# Altium footprint library WARG.PcbLib: 58 footprints (part 1 of 4)
Each footprint in its own frame and in the unit in brackets; x right, y up, seen from the top. Pads: shape width x height; smd on the part's side, far side on the other; paste and mask are expansions set on the pad; w line width, h text height; cw(c..) or ccw(c..) is an arc to the next point about the centre after c.
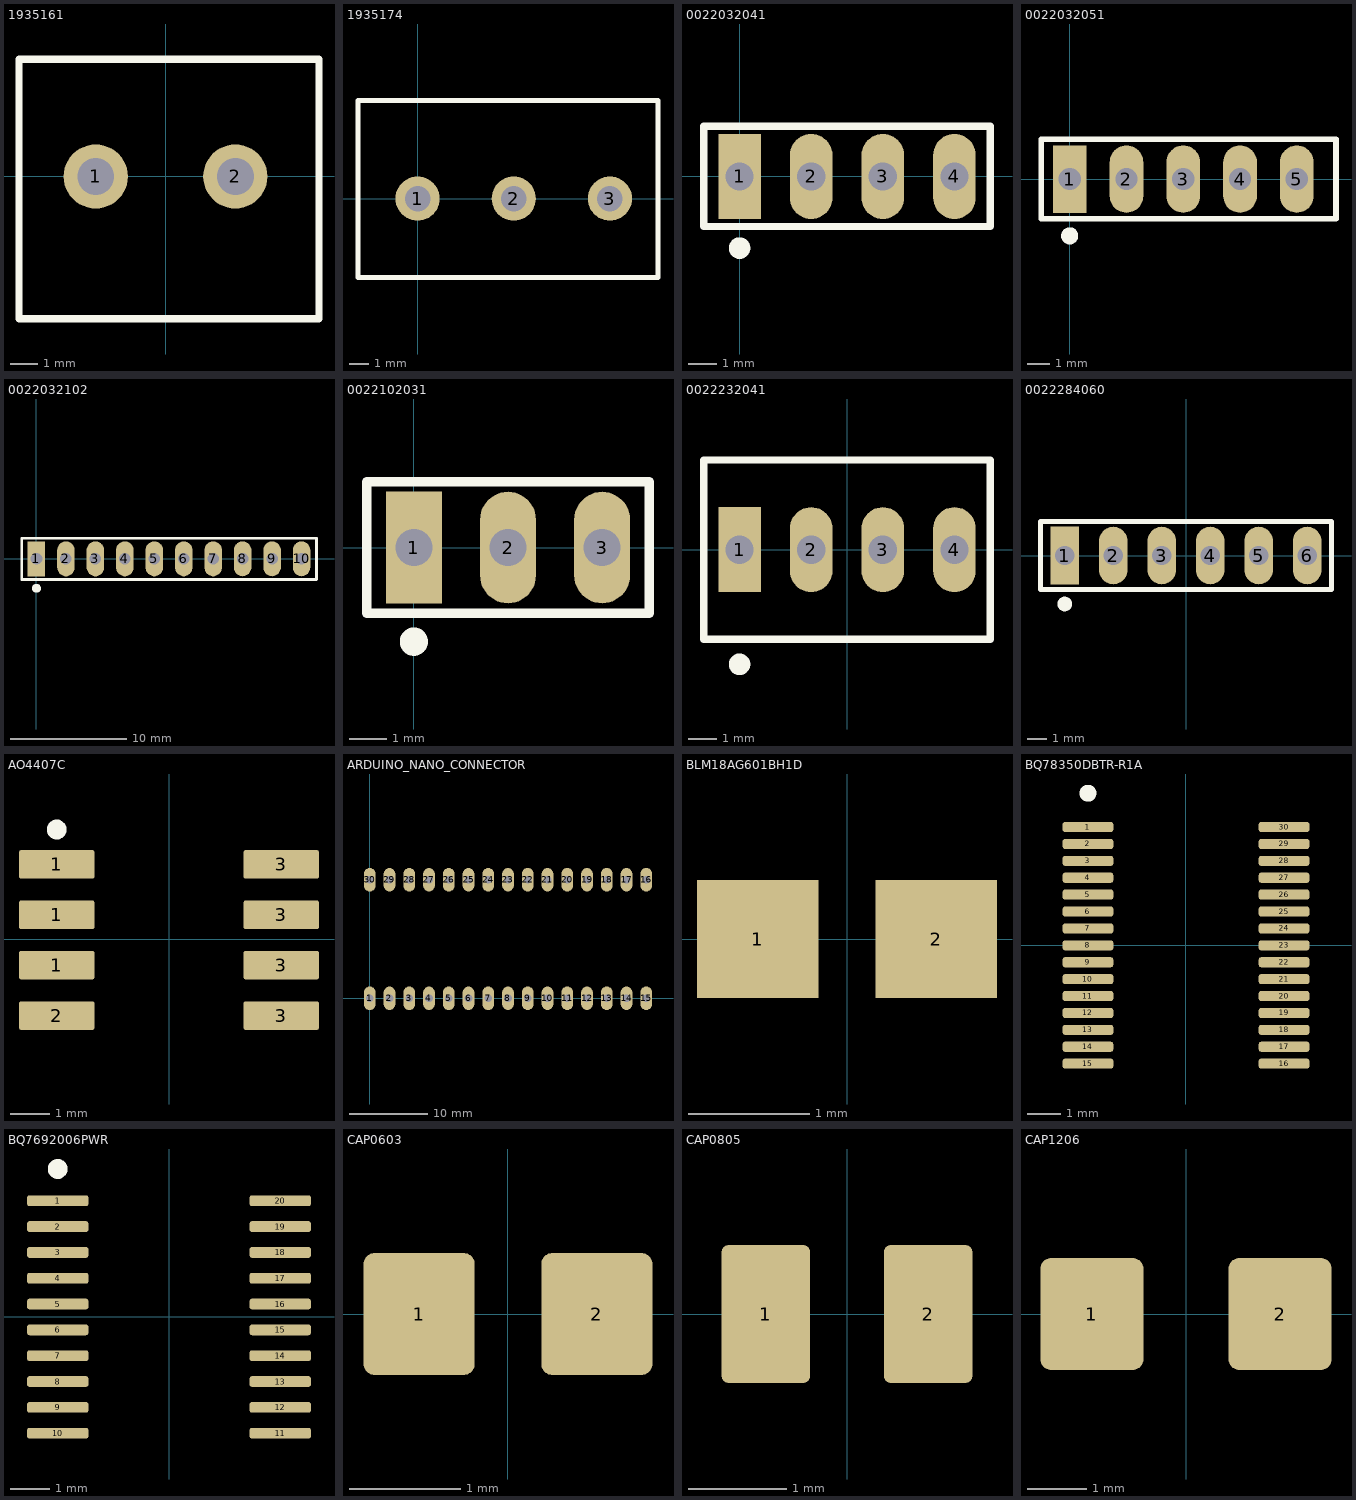
[diagram p0: the footprints below, top view; thin cyan lines are the x and y axes]

## 1935161 [mm] "TERM BLK 2POS SIDE ENTRY 5MM PCB"
pads (2):
  round 2.3 hole 1.325: 1(-2.5,0) 2(2.5,0)
Top Overlay:
  lines w0.254: -5.25,-5.1 -5.25,4.2 5.5,4.2 5.5,-5.1 -5.25,-5.1
3D body "1935161--3DModel-STEP-56544.STEP": height 11.41, standoff -3.49, extent -5.066,-4.936 5.334,4.064

## 1935174 [mm] "TERM BLK 3POS SIDE ENTRY 5MM PCB"
pads (3):
  round 2.3 hole 1.325: 1(0,0) 2(5,0) 3(10,0)
Top Overlay:
  lines w0.254: -3.1,-4.1 -3.1,5.1 12.5,5.1 12.5,-4.1 -3.1,-4.1
3D body "3pin_Phoenix_Contact_Screw_Terminal.STEP": height 11.41, standoff -3.49, extent -3.07,-4 12.5,5

## 0022032041 [mm] "Male 4 Pin Hdr Unshrouded"
pads (4):
  rect 1.508x3.016 hole 1: 1(0,0)
  oval 1.508x3.016 hole 1: 2(2.54,0) 3(5.08,0) 4(7.62,0)
Top Overlay:
  circle w0.508: c0,-2.54 r0.127
  lines w0.254: -1.27,-1.778 8.89,-1.778 8.89,1.27 8.89,1.778 -1.27,1.778 -1.27,1.27 -1.27,-1.778
3D body "0022032041.STEP": height 10.8, standoff -3.42, extent -1.145,-1.17 8.765,1.17

## 0022032051 [mm] "5 Pin Male Header"
pads (5):
  rect 1.508x3.016 hole 1: 1(0,0)
  oval 1.508x3.016 hole 1: 2(2.54,0) 3(5.08,0) 4(7.62,0) 5(10.16,0)
Top Overlay:
  circle w0.508: c0,-2.54 r0.127
  lines w0.254: 11.913,1.753 11.913,-1.778 -1.27,-1.778 -1.27,1.27 -1.27,1.778 11.913,1.778
3D body "0022032051.STEP": height 10.8, standoff -3.42, extent -1.145,-1.17 11.305,1.17

## 0022032102 [mm] "10 Pin Male Header"
pads (10):
  rect 1.508x3.016 hole 1: 1(0,0)
  oval 1.508x3.016 hole 1: 2(2.54,0) 3(5.08,0) 4(7.62,0) 5(10.16,0) 6(12.7,0) 7(15.24,0) 8(17.775,0.005) 9(20.319,0.005) 10(22.855,0.005)
Top Overlay:
  circle w0.508: c0,-2.54 r0.127
  lines w0.254: -1.27,-1.778 11.913,-1.778 24.13,-1.778 24.13,1.778 -1.27,1.778 -1.27,1.27 -1.27,-1.778
3D body "0022032102.STEP": height 14.36, standoff -3.17, extent -1.145,-1.17 24.005,1.17

## 0022102031 [mm] "3 Pin Male Header"
pads (3):
  rect 1.508x3.016 hole 1: 1(0,0)
  oval 1.508x3.016 hole 1: 2(2.54,0) 3(5.08,0)
Top Overlay:
  circle w0.508: c0,-2.54 r0.127
  lines w0.254: -1.27,-1.778 6.35,-1.778 6.35,1.778 -1.27,1.778 -1.27,1.27 -1.27,-1.778
3D body "0022102031.STEP": height 10.8, standoff -3.42, extent -1.145,-1.17 6.225,1.17

## 0022232041 [mm]
pads (4):
  rect 1.508x3.016 hole 1: 1(-3.81,0)
  oval 1.508x3.016 hole 1: 2(-1.27,0) 3(1.27,0) 4(3.81,0)
Top Overlay:
  circle w0.508: c-3.81,-4.064 r0.127
  lines w0.254: -5.08,-3.175 5.08,-3.175 5.08,1.27 5.08,3.175 -5.08,3.175 -5.08,1.27 -5.08,-3.175
3D body "022232041.stp": height 10.68, standoff -3.54, extent -5.004,-3.099 5.004,3.251

## 0022284060 [mm] "6 Pin Male Header"
pads (6):
  rect 1.508x3.016 hole 1: 1(-6.35,0)
  oval 1.508x3.016 hole 1: 2(-3.81,0) 3(-1.27,0) 4(1.27,0) 5(3.81,0) 6(6.35,0)
Top Overlay:
  circle w0.508: c-6.35,-2.54 r0.127
  lines w0.254: -7.62,-1.778 -7.62,1.27 -7.62,1.778 7.62,1.778 7.62,-1.778 5.563,-1.778 -7.62,-1.778
3D body "022284060.stp": height 8.39, standoff -3.16, extent -7.62,-1.245 7.62,1.245

## AO4407C [mm] "MOSFET P-CH 30V 14A SO-8"
pads (8):
  rrect15% 1.9x0.72 smd: 1(-2.827,-0.656) 1(-2.827,0.614) 1(-2.827,1.884) 2(-2.827,-1.926) 3(2.823,-1.926) 3(2.823,-0.656) 3(2.823,0.614) 3(2.823,1.884)
Top Overlay:
  circle w0.25: c-2.827,2.759 r0.125
3D body "User Library-SOIC-8-1.step": height 1.75, standoff 0, extent -3,-2.45 3,2.45

## ARDUINO_NANO_CONNECTOR [mm] "2x15 pin headers"
pads (30):
  oval 1.508x3.016 hole 1: 1(0,0) 2(2.54,0) 3(5.08,0) 4(7.62,0) 5(10.16,0) 6(12.7,0) 7(15.24,0) 8(17.775,0.005) 9(20.319,0.005) 10(22.855,0.005) 11(25.395,0.005) 12(27.935,0.005) 13(30.475,0.005) 14(33.015,0.005) 15(35.555,0.005) 16(35.555,15.245) 17(33.015,15.245) 18(30.475,15.245) 19(27.935,15.245) 20(25.395,15.245) 21(22.855,15.245) 22(20.319,15.245) 23(17.775,15.245) 24(15.24,15.24) 25(12.7,15.24) 26(10.16,15.24) 27(7.62,15.24) 28(5.08,15.24) 29(2.54,15.24) 30(0,15.24)
3D body "Conn_Sullins_PPTC151LFBN-RC_eec.STEP": height 8.5, standoff -3.2, extent -1.52,13.97 37.08,16.51
3D body "User Library-Arduino Nano 3_0.STEP": height 20.88, standoff 2.62, extent -3.82,-1.65 41.009,16.89
3D body "Conn_Sullins_PPTC151LFBN-RC_eec.STEP": height 8.5, standoff -3.2, extent -1.525,-1.265 37.075,1.275

## BLM18AG601BH1D [mm]
pads (2):
  rect 1x0.97 smd: 1(-0.735,0) 2(0.735,0)
3D body "BLM18AG601SN1D.STEP": height 0.81, standoff 0.01, extent -0.8,-0.475 0.8,0.475

## BQ78350DBTR-R1A [mm] "IC BATT MON LI-ION 3-15C 30TSSOP"
pads (30):
  rrect50% 1.5x0.3 smd: 1(-2.9,3.5) 2(-2.9,3) 3(-2.9,2.5) 4(-2.9,2) 5(-2.9,1.5) 6(-2.9,1) 7(-2.9,0.5) 8(-2.9,0) 9(-2.9,-0.5) 10(-2.9,-1) 11(-2.9,-1.5) 12(-2.9,-2) 13(-2.9,-2.5) 14(-2.9,-3) 15(-2.9,-3.5) 16(2.9,-3.5) 17(2.9,-3) 18(2.9,-2.5) 19(2.9,-2) 20(2.9,-1.5) 21(2.9,-1) 22(2.9,-0.5) 23(2.9,0) 24(2.9,0.5) 25(2.9,1) 26(2.9,1.5) 27(2.9,2) 28(2.9,2.5) 29(2.9,3) 30(2.9,3.5)
Top Overlay:
  circle w0.25: c-2.9,4.5 r0.125
3D body "BQ78350DBTR-R1A.stp": height 1.13, standoff 0, extent -3.2,-3.9 3.2,3.9

## BQ7692006PWR [mm] "IC BATT MON MULTI 3-5C 20TSSOP"
pads (20):
  rrect50% 1.55x0.27 smd: 1(-2.8,2.925) 2(-2.8,2.275) 3(-2.8,1.625) 4(-2.8,0.975) 5(-2.8,0.325) 6(-2.8,-0.325) 7(-2.8,-0.975) 8(-2.8,-1.625) 9(-2.8,-2.275) 10(-2.8,-2.925) 11(2.8,-2.925) 12(2.8,-2.275) 13(2.8,-1.625) 14(2.8,-0.975) 15(2.8,-0.325) 16(2.8,0.325) 17(2.8,0.975) 18(2.8,1.625) 19(2.8,2.275) 20(2.8,2.925)
Top Overlay:
  circle w0.25: c-2.8,3.725 r0.125
3D body "BQ7692006PWR.stp": height 1.13, standoff 0, extent -3.2,-3.25 3.2,3.25

## CAP0603 [mm] "Ceramic Capacitor 0603"
height 0.55
pads (2):
  rrect20% 1x1.1 smd: 1(-0.8,0) 2(0.8,0)
Mechanical 13:
  lines w0.1: -0.875,-0.475 -0.875,0.475 ; 0.875,-0.475 0.875,0.475
3D body: height 0.55, standoff 0, extent 0.525,-0.475 0.875,0.475
3D body: height 0.55, standoff 0, extent -0.875,-0.475 -0.525,0.475
3D body "c0603c101j1gactu.stp": height 0.87, standoff 0, extent -0.875,-0.475 0.875,0.475

## CAP0805 [mm] "Ceramic Capacitor 0805"
pads (2):
  rrect15% 0.9x1.4 smd: 1(-0.825,0) 2(0.825,0)
3D body "CAP0805.stp": height 1.39, standoff -0.01, extent -1.1,-0.725 1.1,0.725

## CAP1206 [mm] "Ceramic Capacitor 1206"
height 0.55
pads (2):
  rrect20% 1.75x1.9 smd: 1(-1.6,0) 2(1.6,0)
3D body "1206.stp": height 0.88, standoff 0, extent -1.7,-0.9 1.7,0.9